# Altium footprint library ZJUDancer_Circuit_V3.6.3.PcbLib: 35 footprints (part 1 of 3)
Each footprint in its own frame and in the unit in brackets; x right, y up, seen from the top. Pads: shape width x height; smd on the part's side, far side on the other; paste and mask are expansions set on the pad; w line width, h text height; cw(c..) or ccw(c..) is an arc to the next point about the centre after c.
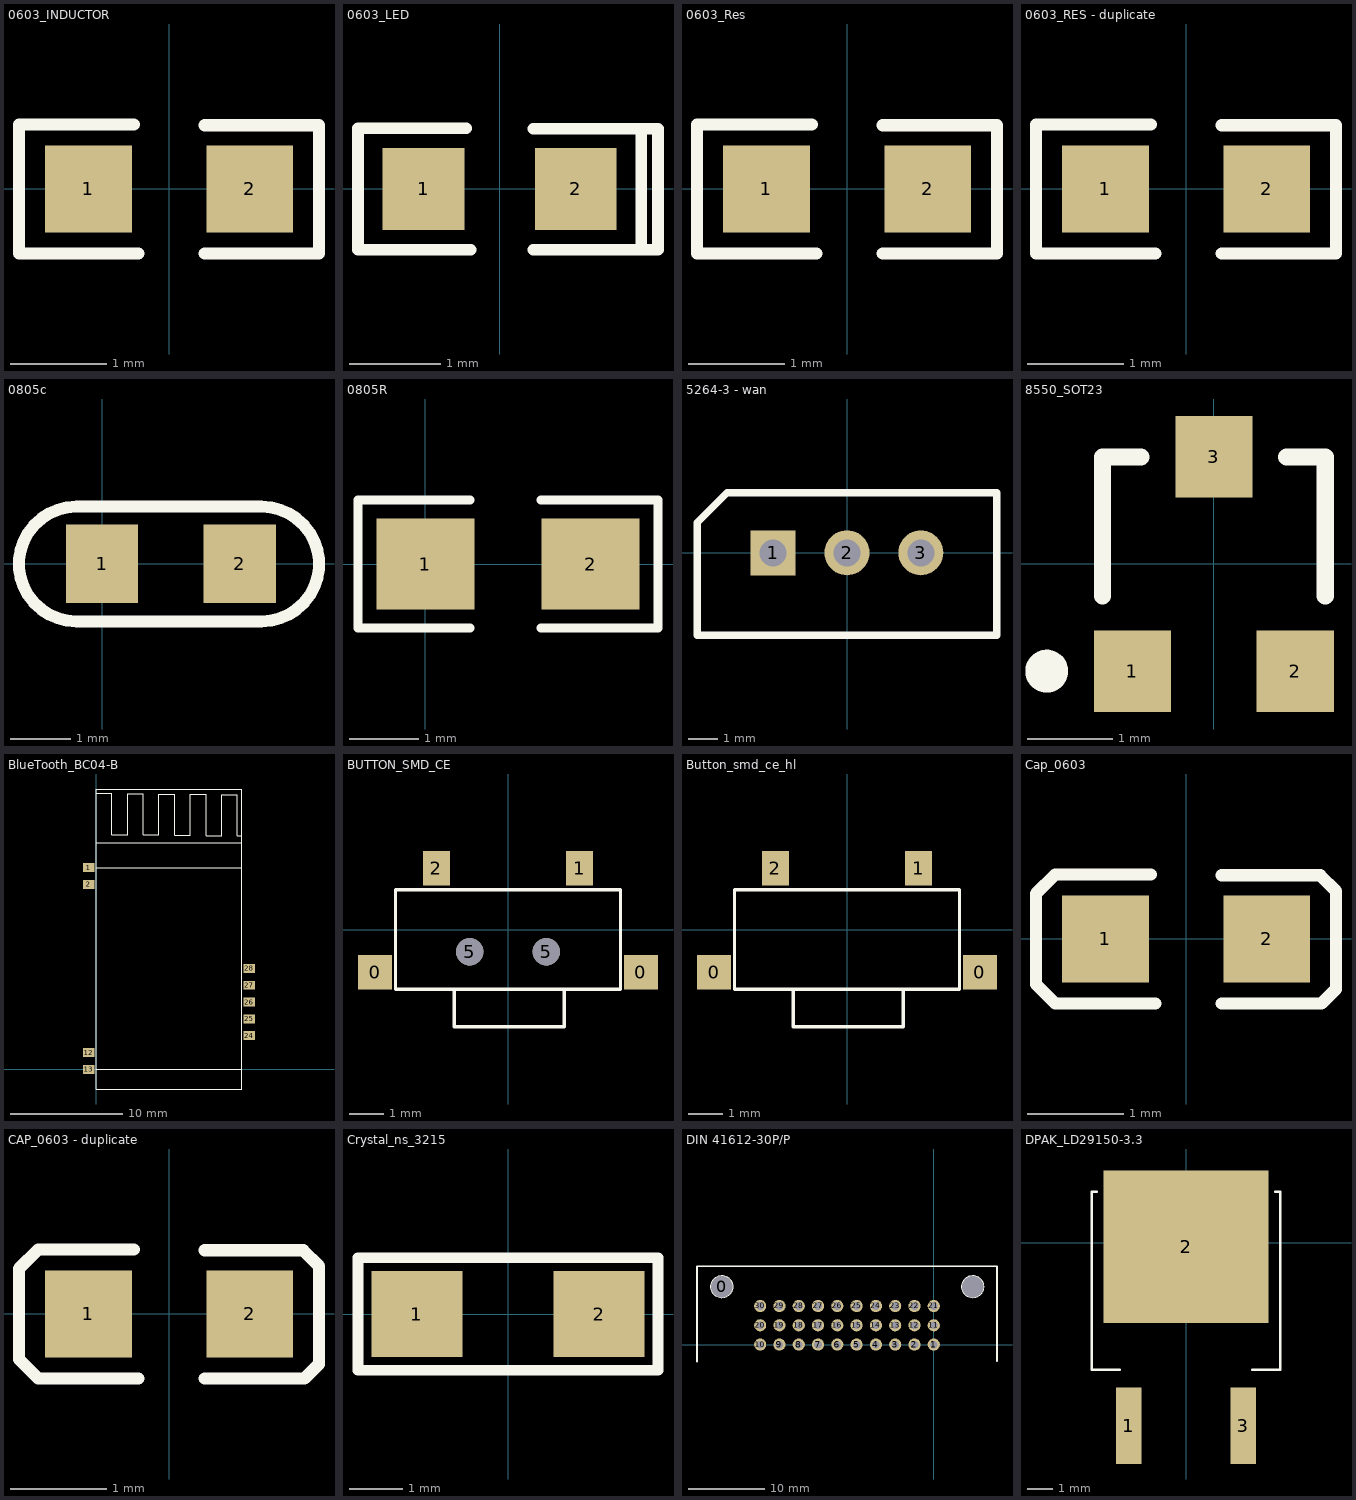
[diagram p0: the footprints below, top view; thin cyan lines are the x and y axes]

## 0603_INDUCTOR [mm]
pads (2):
  rect 0.9x0.9 smd: 1(-0.836,0) 2(0.836,0)
Top Overlay:
  lines w0.127: -0.366,0.668 -1.556,0.668 -1.556,-0.67 -0.316,-0.67 ; 0.37,-0.67 1.554,-0.67 1.554,0.66 0.37,0.66
3D body: height 0.39, standoff 0.02, extent -0.81,-0.4 0.81,0.4

## 0603_LED [mm]
pads (2):
  rect 0.9x0.9 smd: 1(-0.836,0) 2(0.836,0)
Top Overlay:
  lines w0.127: -0.366,0.668 -1.556,0.668 -1.556,-0.67 -0.316,-0.67 ; 0.37,-0.67 1.739,-0.67 1.739,0.66 0.37,0.66 ; 1.554,-0.67 1.554,0.66
3D body: height 0.39, standoff 0.02, extent -0.81,-0.4 0.81,0.4

## 0603_Res [mm]
pads (2):
  rect 0.9x0.9 smd: 1(-0.836,0) 2(0.836,0)
Top Overlay:
  lines w0.127: -0.366,0.668 -1.556,0.668 -1.556,-0.67 -0.316,-0.67 ; 0.37,-0.67 1.554,-0.67 1.554,0.66 0.37,0.66
3D body: height 0.39, standoff 0.02, extent -0.81,-0.4 0.81,0.4

## 0603_RES - duplicate [mm]
pads (2):
  rect 0.9x0.9 smd: 1(-0.836,0) 2(0.836,0)
Top Overlay:
  lines w0.127: -0.366,0.668 -1.556,0.668 -1.556,-0.67 -0.316,-0.67 ; 0.37,-0.67 1.554,-0.67 1.554,0.66 0.37,0.66
3D body: height 0.39, standoff 0.02, extent -0.81,-0.4 0.81,0.4

## 0805c [mm]
pads (2):
  rect 1.2x1.3 smd: 1(0,0) 2(2.286,0)
Top Overlay:
  lines w0.2: -0.428,-0.953 cw(c-0.428,-0.003) -0.428,0.947 2.647,0.947 cw(c2.647,-0.003) 2.647,-0.953 -0.428,-0.953

## 0805R [mm]
pads (2):
  rect 1.4x1.3 smd: 1(0,0) 2(2.362,0)
Top Overlay:
  lines w0.127: 0.635,-0.914 -0.965,-0.914 -0.965,0.914 0.635,0.914 ; 1.651,-0.914 3.327,-0.914 3.327,0.914 1.651,0.914

## 5264-3 - wan [mil]
pads (3):
  rect 60x60 hole 36: 1(-98.43,0)
  round 60 hole 36: 2(0,0) 3(98.43,0)
Top Overlay:
  lines w10: -200,-110 200,-110 200,80 -160,80 -200,40 -200,-110
3D body: height 197.45, standoff -137.2, extent -198.79,-13.78 194.91,277.57

## 8550_SOT23 [mm]
pads (3):
  rect 0.9x0.95 smd: 1(-0.95,-1.25) 2(0.95,-1.25) 3(0,1.25)
Top Overlay:
  circle w0.25: c-1.95,-1.25 r0.125
  lines w0.2: -1.3,-0.375 -1.3,1.25 -0.85,1.25 ; 0.85,1.25 1.3,1.25 1.3,-0.375
3D body: height 1.2, standoff 0, extent -1.45,-1.475 1.45,1.325

## BlueTooth_BC04-B [mm]
pads (9):
  rect 1x0.8 smd: 1(-0.65,18) 2(-0.65,16.5) 12(-0.65,1.5) 13(-0.65,0) 24(13.65,3) 25(13.65,4.5) 26(13.65,6) 27(13.65,7.5) 28(13.65,9)
Top Overlay:
  lines w0.1: 0,20.2 13,20.2 ; 0,24.6 1.4,24.6 1.4,20.925 2.8,20.925 2.8,24.575 4.2,24.575 4.2,20.9 5.6,20.9 5.6,24.55 7,24.55 7,20.875 8.4,20.875 8.4,24.525 9.8,24.525 9.8,20.85 11.2,20.85 11.2,24.5 12.6,24.5 12.6,20.825 13,20.825 ; 13,0 0,0 ; 13,18 0,18 ; 0,0 0,-1.75 13,-1.75 13,25 0,25 0,18 ; 0,0 0,18

## BUTTON_SMD_CE [mm]
pads (6):
  rect 1x1 smd: 0(-3.9,-1.25) 0(3.9,-1.25)
  rect 0.8x1 smd: 1(2.1,1.8) 2(-2.1,1.8)
  round 0.8 hole 0.8: 5(-1.125,-0.65) 5(1.125,-0.65)
Top Overlay:
  lines w0.1: -1.575,-1.75 -1.575,-2.85 1.65,-2.85 1.65,-1.75 ; -3.3,-1.75 -3.3,1.175 3.3,1.175 3.3,-1.75 -3.3,-1.75
3D body: height 3.42, standoff -0.78, extent -3.95,-2.7 3.85,2

## Button_smd_ce_hl [mm]
pads (4):
  rect 1x1 smd: 0(-3.9,-1.25) 0(3.9,-1.25)
  rect 0.8x1 smd: 1(2.1,1.8) 2(-2.1,1.8)
Top Overlay:
  lines w0.1: -1.575,-1.75 -1.575,-2.85 1.65,-2.85 1.65,-1.75 ; -3.3,-1.75 3.3,-1.75 3.3,1.175 -3.3,1.175 -3.3,-1.75
3D body: height 3.42, standoff -0.78, extent -3.95,-2.7 3.85,2

## Cap_0603 [mm]
pads (2):
  rect 0.9x0.9 smd: 1(-0.836,0) 2(0.836,0)
Top Overlay:
  lines w0.127: -0.366,0.668 -1.357,0.668 -1.556,0.469 -1.556,-0.469 -1.355,-0.67 -0.316,-0.67 ; 0.37,-0.67 1.405,-0.67 1.554,-0.521 1.554,0.496 1.39,0.66 0.37,0.66
3D body: height 0.56, standoff 0.02, extent -0.835,-0.415 0.835,0.425

## CAP_0603 - duplicate [mm]
pads (2):
  rect 0.9x0.9 smd: 1(-0.836,0) 2(0.836,0)
Top Overlay:
  lines w0.127: -0.366,0.668 -1.357,0.668 -1.556,0.469 -1.556,-0.469 -1.355,-0.67 -0.316,-0.67 ; 0.37,-0.67 1.405,-0.67 1.554,-0.521 1.554,0.496 1.39,0.66 0.37,0.66
3D body: height 0.56, standoff 0.02, extent -0.835,-0.415 0.835,0.425

## Crystal_ns_3215 [mm]
pads (2):
  rect 1.7x1.6 smd: 1(-1.7,0) 2(1.7,0)
Top Overlay:
  lines w0.2: -2.8,-1.05 2.8,-1.05 2.8,1.05 -2.8,1.05 -2.8,-1.05
3D body: height 0.82, standoff 0.02, extent -1.6,-0.75 1.6,0.75

## DIN 41612-30P/P [mm]
pads (32):
  round 2.8 hole 2.8 mask+0: 0(-27.91,7.62)
  oval 0x2.8 hole 2.8 mask+0: 0(5.12,7.62)
  round 1.6 hole 1: 1(0,0) 2(-2.54,0) 3(-5.08,0) 4(-7.62,0) 5(-10.16,0) 6(-12.7,0) 7(-15.24,0) 8(-17.78,0) 9(-20.32,0) 10(-22.86,0) 11(0,2.54) 12(-2.54,2.54) 13(-5.08,2.54) 14(-7.62,2.54) 15(-10.16,2.54) 16(-12.7,2.54) 17(-15.24,2.54) 18(-17.78,2.54) 19(-20.32,2.54) 20(-22.86,2.54) 21(0,5.08) 22(-2.54,5.08) 23(-5.08,5.08) 24(-7.62,5.08) 25(-10.16,5.08) 26(-12.7,5.08) 27(-15.24,5.08) 28(-17.78,5.08) 29(-20.32,5.08) 30(-22.86,5.08)
Top Overlay:
  circle w0.254: c-27.91,7.62 r1.4
  circle w0.254: c5.12,7.62 r1.4
  lines w0.2: -31.175,-2.275 -31.175,10.322 8.325,10.327 8.325,-2.225

## DPAK_LD29150-3.3 [mm]
pads (3):
  rect 1x3 smd: 1(-2.25,-7.196) 3(2.25,-7.196)
  rect 6.5x6 smd: 2(0,-0.163)
Top Overlay:
  lines w0.1: -3.5,2 -3.7,2 -3.7,-5 -2.6,-5 ; 2.6,-5 3.7,-5 3.7,2 3.5,2
3D body: height 2.32, standoff 0.02, extent -3.25,-8 3.25,2